# Altium schematic symbol library jlcpcb_2025_04_capacitors_extended_0603.schlib: 3668 symbols (part 5 of 20)
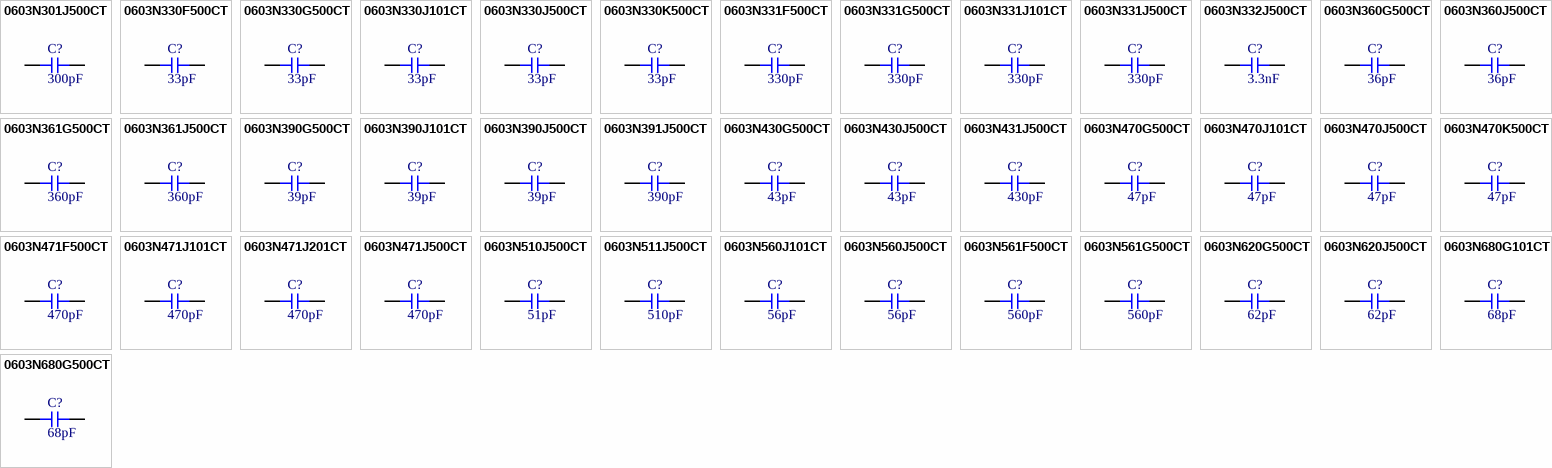
[diagram p95: symbols 0603N301J500CT to 0603N680G500CT]

## 0603N330J101CT
designator C?  Capacitance: 33pF  (hidden comment: *)
Capacitor, Ceramic (MLCC), 33pF, ±5%, 100V, NP0, ±5%, SMD 0603; Manufacturer: Walsin Tech Corp; Manufacturer Part Number: 0603N330J101CT; Package Size: 0603; JLCPCB Basic Part: No; JLCPCB Part Number: C77447; Supplier 1: LCSC; Category: Capacitors - MLCC; Supplier Part Number 1: C77447; Tolerance: ±5%; Voltage Rating: 100V; Temperature Coefficient: NP0; RoHS: Yes; ComponentLink1Description: Datasheet; ComponentLink1URL: https://wmsc.lcsc.com/wmsc/upload/file/pdf/v2/lcsc/2304140030_Walsin-Tech-Corp-0603N330J101CT_C77447.pdf; ComponentLink2Description: JLCPCB Part URL; ComponentLink2URL: https://jlcpcb.com/partdetail/C77447; ComponentLink3Description: LCSC Part URL; ComponentLink3URL: https://lcsc.com/product-detail/Multilayer-Ceramic-Capacitors-MLCC---SMD-SMT_Walsin-Tech-Corp-Walsin-Tech-Corp-0603N330J101CT_C77447.html
footprint CAP-0603 (0603 (1608M) Capacitor)
pins: 1, 2

## 0603N330J500CT
designator C?  Capacitance: 33pF  (hidden comment: *)
Capacitor, Ceramic (MLCC), 33pF, ±5%, 50V, NP0, ±5%, SMD 0603; Manufacturer: Walsin Tech Corp; Manufacturer Part Number: 0603N330J500CT; Package Size: 0603; JLCPCB Basic Part: No; JLCPCB Part Number: C302065; Supplier 1: LCSC; Category: Capacitors - MLCC; Supplier Part Number 1: C302065; Tolerance: ±5%; Voltage Rating: 50V; Temperature Coefficient: NP0; RoHS: Yes; ComponentLink1Description: Datasheet; ComponentLink1URL: https://wmsc.lcsc.com/wmsc/upload/file/pdf/v2/lcsc/2304140030_Walsin-Tech-Corp-0603N330J500CT_C302065.pdf; ComponentLink2Description: JLCPCB Part URL; ComponentLink2URL: https://jlcpcb.com/partdetail/C302065; ComponentLink3Description: LCSC Part URL; ComponentLink3URL: https://lcsc.com/product-detail/Multilayer-Ceramic-Capacitors-MLCC---SMD-SMT_Walsin-Tech-Corp-Walsin-Tech-Corp-0603N330J500CT_C302065.html
footprint CAP-0603 (0603 (1608M) Capacitor)
pins: 1, 2

## 0603N330K500CT
designator C?  Capacitance: 33pF  (hidden comment: *)
Capacitor, Ceramic (MLCC), 33pF, ±10%, 50V, NP0, ±10%, SMD 0603; Manufacturer: Walsin Tech Corp; Manufacturer Part Number: 0603N330K500CT; Package Size: 0603; JLCPCB Basic Part: No; JLCPCB Part Number: C296063; Supplier 1: LCSC; Category: Capacitors - MLCC; Supplier Part Number 1: C296063; Tolerance: ±10%; Voltage Rating: 50V; Temperature Coefficient: NP0; RoHS: Yes; ComponentLink1Description: Datasheet; ComponentLink1URL: https://wmsc.lcsc.com/wmsc/upload/file/pdf/v2/lcsc/2304140030_Walsin-Tech-Corp-0603N330K500CT_C296063.pdf; ComponentLink2Description: JLCPCB Part URL; ComponentLink2URL: https://jlcpcb.com/partdetail/C296063; ComponentLink3Description: LCSC Part URL; ComponentLink3URL: https://lcsc.com/product-detail/Multilayer-Ceramic-Capacitors-MLCC---SMD-SMT_Walsin-Tech-Corp-Walsin-Tech-Corp-0603N330K500CT_C296063.html
footprint CAP-0603 (0603 (1608M) Capacitor)
pins: 1, 2

## 0603N331F500CT
designator C?  Capacitance: 330pF  (hidden comment: *)
Capacitor, Ceramic (MLCC), 330pF, ±1%, 50V, NP0, ±1%, SMD 0603; Manufacturer: Walsin Tech Corp; Manufacturer Part Number: 0603N331F500CT; Package Size: 0603; JLCPCB Basic Part: No; JLCPCB Part Number: C458902; Supplier 1: LCSC; Category: Capacitors - MLCC; Supplier Part Number 1: C458902; Tolerance: ±1%; Voltage Rating: 50V; Temperature Coefficient: NP0; RoHS: Yes; ComponentLink1Description: Datasheet; ComponentLink1URL: https://wmsc.lcsc.com/wmsc/upload/file/pdf/v2/lcsc/2304140030_Walsin-Tech-Corp-0603N331F500CT_C458902.pdf; ComponentLink2Description: JLCPCB Part URL; ComponentLink2URL: https://jlcpcb.com/partdetail/C458902; ComponentLink3Description: LCSC Part URL; ComponentLink3URL: https://lcsc.com/product-detail/Multilayer-Ceramic-Capacitors-MLCC---SMD-SMT_Walsin-Tech-Corp-Walsin-Tech-Corp-0603N331F500CT_C458902.html
footprint CAP-0603 (0603 (1608M) Capacitor)
pins: 1, 2

## 0603N331G500CT
designator C?  Capacitance: 330pF  (hidden comment: *)
Capacitor, Ceramic (MLCC), 330pF, ±2%, 50V, NP0, ±2%, SMD 0603; Manufacturer: Walsin Tech Corp; Manufacturer Part Number: 0603N331G500CT; Package Size: 0603; JLCPCB Basic Part: No; JLCPCB Part Number: C458903; Supplier 1: LCSC; Category: Capacitors - MLCC; Supplier Part Number 1: C458903; Tolerance: ±2%; Voltage Rating: 50V; Temperature Coefficient: NP0; RoHS: Yes; ComponentLink1Description: Datasheet; ComponentLink1URL: https://wmsc.lcsc.com/wmsc/upload/file/pdf/v2/lcsc/2304140030_Walsin-Tech-Corp-0603N331G500CT_C458903.pdf; ComponentLink2Description: JLCPCB Part URL; ComponentLink2URL: https://jlcpcb.com/partdetail/C458903; ComponentLink3Description: LCSC Part URL; ComponentLink3URL: https://lcsc.com/product-detail/Multilayer-Ceramic-Capacitors-MLCC---SMD-SMT_Walsin-Tech-Corp-Walsin-Tech-Corp-0603N331G500CT_C458903.html
footprint CAP-0603 (0603 (1608M) Capacitor)
pins: 1, 2

## 0603N331J101CT
designator C?  Capacitance: 330pF  (hidden comment: *)
Capacitor, Ceramic (MLCC), 330pF, ±5%, 100V, NP0, ±5%, SMD 0603; Manufacturer: Walsin Tech Corp; Manufacturer Part Number: 0603N331J101CT; Package Size: 0603; JLCPCB Basic Part: No; JLCPCB Part Number: C388047; Supplier 1: LCSC; Category: Capacitors - MLCC; Supplier Part Number 1: C388047; Tolerance: ±5%; Voltage Rating: 100V; Temperature Coefficient: NP0; RoHS: Yes; ComponentLink1Description: Datasheet; ComponentLink1URL: https://wmsc.lcsc.com/wmsc/upload/file/pdf/v2/lcsc/2304140030_Walsin-Tech-Corp-0603N331J101CT_C388047.pdf; ComponentLink2Description: JLCPCB Part URL; ComponentLink2URL: https://jlcpcb.com/partdetail/C388047; ComponentLink3Description: LCSC Part URL; ComponentLink3URL: https://lcsc.com/product-detail/Multilayer-Ceramic-Capacitors-MLCC---SMD-SMT_Walsin-Tech-Corp-Walsin-Tech-Corp-0603N331J101CT_C388047.html
footprint CAP-0603 (0603 (1608M) Capacitor)
pins: 1, 2

## 0603N331J500CT
designator C?  Capacitance: 330pF  (hidden comment: *)
Capacitor, Ceramic (MLCC), 330pF, ±5%, 50V, NP0, ±5%, SMD 0603; Manufacturer: Walsin Tech Corp; Manufacturer Part Number: 0603N331J500CT; Package Size: 0603; JLCPCB Basic Part: No; JLCPCB Part Number: C340637; Supplier 1: LCSC; Category: Capacitors - MLCC; Supplier Part Number 1: C340637; Tolerance: ±5%; Voltage Rating: 50V; Temperature Coefficient: NP0; RoHS: Yes; ComponentLink1Description: Datasheet; ComponentLink1URL: https://wmsc.lcsc.com/wmsc/upload/file/pdf/v2/lcsc/2304140030_Walsin-Tech-Corp-0603N331J500CT_C340637.pdf; ComponentLink2Description: JLCPCB Part URL; ComponentLink2URL: https://jlcpcb.com/partdetail/C340637; ComponentLink3Description: LCSC Part URL; ComponentLink3URL: https://lcsc.com/product-detail/Multilayer-Ceramic-Capacitors-MLCC---SMD-SMT_Walsin-Tech-Corp-Walsin-Tech-Corp-0603N331J500CT_C340637.html
footprint CAP-0603 (0603 (1608M) Capacitor)
pins: 1, 2

## 0603N332J500CT
designator C?  Capacitance: 3.3nF  (hidden comment: *)
Capacitor, Ceramic (MLCC), 3.3nF, ±5%, 50V, NP0, ±5%, SMD 0603; Manufacturer: Walsin Tech Corp; Manufacturer Part Number: 0603N332J500CT; Package Size: 0603; JLCPCB Basic Part: No; JLCPCB Part Number: C152910; Supplier 1: LCSC; Category: Capacitors - MLCC; Supplier Part Number 1: C152910; Tolerance: ±5%; Voltage Rating: 50V; Temperature Coefficient: NP0; RoHS: Yes; ComponentLink1Description: Datasheet; ComponentLink1URL: https://wmsc.lcsc.com/wmsc/upload/file/pdf/v2/lcsc/2304140030_Walsin-Tech-Corp-0603N332J500CT_C152910.pdf; ComponentLink2Description: JLCPCB Part URL; ComponentLink2URL: https://jlcpcb.com/partdetail/C152910; ComponentLink3Description: LCSC Part URL; ComponentLink3URL: https://lcsc.com/product-detail/Multilayer-Ceramic-Capacitors-MLCC---SMD-SMT_Walsin-Tech-Corp-Walsin-Tech-Corp-0603N332J500CT_C152910.html
footprint CAP-0603 (0603 (1608M) Capacitor)
pins: 1, 2

## 0603N360G500CT
designator C?  Capacitance: 36pF  (hidden comment: *)
Capacitor, Ceramic (MLCC), 36pF, ±2%, 50V, NP0, ±2%, SMD 0603; Manufacturer: Walsin Tech Corp; Manufacturer Part Number: 0603N360G500CT; Package Size: 0603; JLCPCB Basic Part: No; JLCPCB Part Number: C152909; Supplier 1: LCSC; Category: Capacitors - MLCC; Supplier Part Number 1: C152909; Tolerance: ±2%; Voltage Rating: 50V; Temperature Coefficient: NP0; RoHS: Yes; ComponentLink1Description: Datasheet; ComponentLink1URL: https://wmsc.lcsc.com/wmsc/upload/file/pdf/v2/lcsc/2304140030_Walsin-Tech-Corp-0603N360G500CT_C152909.pdf; ComponentLink2Description: JLCPCB Part URL; ComponentLink2URL: https://jlcpcb.com/partdetail/C152909; ComponentLink3Description: LCSC Part URL; ComponentLink3URL: https://lcsc.com/product-detail/Multilayer-Ceramic-Capacitors-MLCC---SMD-SMT_Walsin-Tech-Corp-Walsin-Tech-Corp-0603N360G500CT_C152909.html
footprint CAP-0603 (0603 (1608M) Capacitor)
pins: 1, 2

## 0603N360J500CT
designator C?  Capacitance: 36pF  (hidden comment: *)
Capacitor, Ceramic (MLCC), 36pF, ±5%, 50V, NP0, ±5%, SMD 0603; Manufacturer: Walsin Tech Corp; Manufacturer Part Number: 0603N360J500CT; Package Size: 0603; JLCPCB Basic Part: No; JLCPCB Part Number: C388048; Supplier 1: LCSC; Category: Capacitors - MLCC; Supplier Part Number 1: C388048; Tolerance: ±5%; Voltage Rating: 50V; Temperature Coefficient: NP0; RoHS: Yes; ComponentLink1Description: Datasheet; ComponentLink1URL: https://wmsc.lcsc.com/wmsc/upload/file/pdf/v2/lcsc/2304140030_Walsin-Tech-Corp-0603N360J500CT_C388048.pdf; ComponentLink2Description: JLCPCB Part URL; ComponentLink2URL: https://jlcpcb.com/partdetail/C388048; ComponentLink3Description: LCSC Part URL; ComponentLink3URL: https://lcsc.com/product-detail/Multilayer-Ceramic-Capacitors-MLCC---SMD-SMT_Walsin-Tech-Corp-Walsin-Tech-Corp-0603N360J500CT_C388048.html
footprint CAP-0603 (0603 (1608M) Capacitor)
pins: 1, 2

## 0603N361G500CT
designator C?  Capacitance: 360pF  (hidden comment: *)
Capacitor, Ceramic (MLCC), 360pF, ±2%, 50V, NP0, ±2%, SMD 0603; Manufacturer: Walsin Tech Corp; Manufacturer Part Number: 0603N361G500CT; Package Size: 0603; JLCPCB Basic Part: No; JLCPCB Part Number: C458904; Supplier 1: LCSC; Category: Capacitors - MLCC; Supplier Part Number 1: C458904; Tolerance: ±2%; Voltage Rating: 50V; Temperature Coefficient: NP0; RoHS: Yes; ComponentLink1Description: Datasheet; ComponentLink1URL: https://wmsc.lcsc.com/wmsc/upload/file/pdf/v2/lcsc/2304140030_Walsin-Tech-Corp-0603N361G500CT_C458904.pdf; ComponentLink2Description: JLCPCB Part URL; ComponentLink2URL: https://jlcpcb.com/partdetail/C458904; ComponentLink3Description: LCSC Part URL; ComponentLink3URL: https://lcsc.com/product-detail/Multilayer-Ceramic-Capacitors-MLCC---SMD-SMT_Walsin-Tech-Corp-Walsin-Tech-Corp-0603N361G500CT_C458904.html
footprint CAP-0603 (0603 (1608M) Capacitor)
pins: 1, 2

## 0603N361J500CT
designator C?  Capacitance: 360pF  (hidden comment: *)
Capacitor, Ceramic (MLCC), 360pF, ±5%, 50V, NP0, ±5%, SMD 0603; Manufacturer: Walsin Tech Corp; Manufacturer Part Number: 0603N361J500CT; Package Size: 0603; JLCPCB Basic Part: No; JLCPCB Part Number: C237214; Supplier 1: LCSC; Category: Capacitors - MLCC; Supplier Part Number 1: C237214; Tolerance: ±5%; Voltage Rating: 50V; Temperature Coefficient: NP0; RoHS: Yes; ComponentLink1Description: Datasheet; ComponentLink1URL: https://wmsc.lcsc.com/wmsc/upload/file/pdf/v2/lcsc/2304140030_Walsin-Tech-Corp-0603N361J500CT_C237214.pdf; ComponentLink2Description: JLCPCB Part URL; ComponentLink2URL: https://jlcpcb.com/partdetail/C237214; ComponentLink3Description: LCSC Part URL; ComponentLink3URL: https://lcsc.com/product-detail/Multilayer-Ceramic-Capacitors-MLCC---SMD-SMT_Walsin-Tech-Corp-Walsin-Tech-Corp-0603N361J500CT_C237214.html
footprint CAP-0603 (0603 (1608M) Capacitor)
pins: 1, 2

## 0603N390G500CT
designator C?  Capacitance: 39pF  (hidden comment: *)
Capacitor, Ceramic (MLCC), 39pF, ±2%, 50V, NP0, ±2%, SMD 0603; Manufacturer: Walsin Tech Corp; Manufacturer Part Number: 0603N390G500CT; Package Size: 0603; JLCPCB Basic Part: No; JLCPCB Part Number: C388049; Supplier 1: LCSC; Category: Capacitors - MLCC; Supplier Part Number 1: C388049; Tolerance: ±2%; Voltage Rating: 50V; Temperature Coefficient: NP0; RoHS: Yes; ComponentLink1Description: Datasheet; ComponentLink1URL: https://wmsc.lcsc.com/wmsc/upload/file/pdf/v2/lcsc/2304140030_Walsin-Tech-Corp-0603N390G500CT_C388049.pdf; ComponentLink2Description: JLCPCB Part URL; ComponentLink2URL: https://jlcpcb.com/partdetail/C388049; ComponentLink3Description: LCSC Part URL; ComponentLink3URL: https://lcsc.com/product-detail/Multilayer-Ceramic-Capacitors-MLCC---SMD-SMT_Walsin-Tech-Corp-Walsin-Tech-Corp-0603N390G500CT_C388049.html
footprint CAP-0603 (0603 (1608M) Capacitor)
pins: 1, 2

## 0603N390J101CT
designator C?  Capacitance: 39pF  (hidden comment: *)
Capacitor, Ceramic (MLCC), 39pF, ±5%, 100V, NP0, ±5%, SMD 0603; Manufacturer: Walsin Tech Corp; Manufacturer Part Number: 0603N390J101CT; Package Size: 0603; JLCPCB Basic Part: No; JLCPCB Part Number: C388050; Supplier 1: LCSC; Category: Capacitors - MLCC; Supplier Part Number 1: C388050; Tolerance: ±5%; Voltage Rating: 100V; Temperature Coefficient: NP0; RoHS: Yes; ComponentLink1Description: Datasheet; ComponentLink1URL: https://wmsc.lcsc.com/wmsc/upload/file/pdf/v2/lcsc/2304140030_Walsin-Tech-Corp-0603N390J101CT_C388050.pdf; ComponentLink2Description: JLCPCB Part URL; ComponentLink2URL: https://jlcpcb.com/partdetail/C388050; ComponentLink3Description: LCSC Part URL; ComponentLink3URL: https://lcsc.com/product-detail/Multilayer-Ceramic-Capacitors-MLCC---SMD-SMT_Walsin-Tech-Corp-Walsin-Tech-Corp-0603N390J101CT_C388050.html
footprint CAP-0603 (0603 (1608M) Capacitor)
pins: 1, 2

## 0603N390J500CT
designator C?  Capacitance: 39pF  (hidden comment: *)
Capacitor, Ceramic (MLCC), 39pF, ±5%, 50V, NP0, ±5%, SMD 0603; Manufacturer: Walsin Tech Corp; Manufacturer Part Number: 0603N390J500CT; Package Size: 0603; JLCPCB Basic Part: No; JLCPCB Part Number: C302067; Supplier 1: LCSC; Category: Capacitors - MLCC; Supplier Part Number 1: C302067; Tolerance: ±5%; Voltage Rating: 50V; Temperature Coefficient: NP0; RoHS: Yes; ComponentLink1Description: Datasheet; ComponentLink1URL: https://wmsc.lcsc.com/wmsc/upload/file/pdf/v2/lcsc/2304140030_Walsin-Tech-Corp-0603N390J500CT_C302067.pdf; ComponentLink2Description: JLCPCB Part URL; ComponentLink2URL: https://jlcpcb.com/partdetail/C302067; ComponentLink3Description: LCSC Part URL; ComponentLink3URL: https://lcsc.com/product-detail/Multilayer-Ceramic-Capacitors-MLCC---SMD-SMT_Walsin-Tech-Corp-Walsin-Tech-Corp-0603N390J500CT_C302067.html
footprint CAP-0603 (0603 (1608M) Capacitor)
pins: 1, 2

## 0603N391J500CT
designator C?  Capacitance: 390pF  (hidden comment: *)
Capacitor, Ceramic (MLCC), 390pF, ±5%, 50V, NP0, ±5%, SMD 0603; Manufacturer: Walsin Tech Corp; Manufacturer Part Number: 0603N391J500CT; Package Size: 0603; JLCPCB Basic Part: No; JLCPCB Part Number: C152906; Supplier 1: LCSC; Category: Capacitors - MLCC; Supplier Part Number 1: C152906; Tolerance: ±5%; Voltage Rating: 50V; Temperature Coefficient: NP0; RoHS: Yes; ComponentLink1Description: Datasheet; ComponentLink1URL: https://wmsc.lcsc.com/wmsc/upload/file/pdf/v2/lcsc/2304140030_Walsin-Tech-Corp-0603N391J500CT_C152906.pdf; ComponentLink2Description: JLCPCB Part URL; ComponentLink2URL: https://jlcpcb.com/partdetail/C152906; ComponentLink3Description: LCSC Part URL; ComponentLink3URL: https://lcsc.com/product-detail/Multilayer-Ceramic-Capacitors-MLCC---SMD-SMT_Walsin-Tech-Corp-Walsin-Tech-Corp-0603N391J500CT_C152906.html
footprint CAP-0603 (0603 (1608M) Capacitor)
pins: 1, 2

## 0603N430G500CT
designator C?  Capacitance: 43pF  (hidden comment: *)
Capacitor, Ceramic (MLCC), 43pF, ±2%, 50V, NP0, ±2%, SMD 0603; Manufacturer: Walsin Tech Corp; Manufacturer Part Number: 0603N430G500CT; Package Size: 0603; JLCPCB Basic Part: No; JLCPCB Part Number: C302068; Supplier 1: LCSC; Category: Capacitors - MLCC; Supplier Part Number 1: C302068; Tolerance: ±2%; Voltage Rating: 50V; Temperature Coefficient: NP0; RoHS: Yes; ComponentLink1Description: Datasheet; ComponentLink1URL: https://wmsc.lcsc.com/wmsc/upload/file/pdf/v2/lcsc/2304140030_Walsin-Tech-Corp-0603N430G500CT_C302068.pdf; ComponentLink2Description: JLCPCB Part URL; ComponentLink2URL: https://jlcpcb.com/partdetail/C302068; ComponentLink3Description: LCSC Part URL; ComponentLink3URL: https://lcsc.com/product-detail/Multilayer-Ceramic-Capacitors-MLCC---SMD-SMT_Walsin-Tech-Corp-Walsin-Tech-Corp-0603N430G500CT_C302068.html
footprint CAP-0603 (0603 (1608M) Capacitor)
pins: 1, 2

## 0603N430J500CT
designator C?  Capacitance: 43pF  (hidden comment: *)
Capacitor, Ceramic (MLCC), 43pF, ±5%, 50V, NP0, ±5%, SMD 0603; Manufacturer: Walsin Tech Corp; Manufacturer Part Number: 0603N430J500CT; Package Size: 0603; JLCPCB Basic Part: No; JLCPCB Part Number: C388054; Supplier 1: LCSC; Category: Capacitors - MLCC; Supplier Part Number 1: C388054; Tolerance: ±5%; Voltage Rating: 50V; Temperature Coefficient: NP0; RoHS: Yes; ComponentLink1Description: Datasheet; ComponentLink1URL: https://wmsc.lcsc.com/wmsc/upload/file/pdf/v2/lcsc/2304140030_Walsin-Tech-Corp-0603N430J500CT_C388054.pdf; ComponentLink2Description: JLCPCB Part URL; ComponentLink2URL: https://jlcpcb.com/partdetail/C388054; ComponentLink3Description: LCSC Part URL; ComponentLink3URL: https://lcsc.com/product-detail/Multilayer-Ceramic-Capacitors-MLCC---SMD-SMT_Walsin-Tech-Corp-Walsin-Tech-Corp-0603N430J500CT_C388054.html
footprint CAP-0603 (0603 (1608M) Capacitor)
pins: 1, 2

## 0603N431J500CT
designator C?  Capacitance: 430pF  (hidden comment: *)
Capacitor, Ceramic (MLCC), 430pF, ±5%, 50V, NP0, ±5%, SMD 0603; Manufacturer: Walsin Tech Corp; Manufacturer Part Number: 0603N431J500CT; Package Size: 0603; JLCPCB Basic Part: No; JLCPCB Part Number: C237216; Supplier 1: LCSC; Category: Capacitors - MLCC; Supplier Part Number 1: C237216; Tolerance: ±5%; Voltage Rating: 50V; Temperature Coefficient: NP0; RoHS: Yes; ComponentLink1Description: Datasheet; ComponentLink1URL: https://wmsc.lcsc.com/wmsc/upload/file/pdf/v2/lcsc/2304140030_Walsin-Tech-Corp-0603N431J500CT_C237216.pdf; ComponentLink2Description: JLCPCB Part URL; ComponentLink2URL: https://jlcpcb.com/partdetail/C237216; ComponentLink3Description: LCSC Part URL; ComponentLink3URL: https://lcsc.com/product-detail/Multilayer-Ceramic-Capacitors-MLCC---SMD-SMT_Walsin-Tech-Corp-Walsin-Tech-Corp-0603N431J500CT_C237216.html
footprint CAP-0603 (0603 (1608M) Capacitor)
pins: 1, 2

## 0603N470G500CT
designator C?  Capacitance: 47pF  (hidden comment: *)
Capacitor, Ceramic (MLCC), 47pF, ±2%, 50V, NP0, ±2%, SMD 0603; Manufacturer: Walsin Tech Corp; Manufacturer Part Number: 0603N470G500CT; Package Size: 0603; JLCPCB Basic Part: No; JLCPCB Part Number: C388055; Supplier 1: LCSC; Category: Capacitors - MLCC; Supplier Part Number 1: C388055; Tolerance: ±2%; Voltage Rating: 50V; Temperature Coefficient: NP0; RoHS: Yes; ComponentLink1Description: Datasheet; ComponentLink1URL: https://wmsc.lcsc.com/wmsc/upload/file/pdf/v2/lcsc/2304140030_Walsin-Tech-Corp-0603N470G500CT_C388055.pdf; ComponentLink2Description: JLCPCB Part URL; ComponentLink2URL: https://jlcpcb.com/partdetail/C388055; ComponentLink3Description: LCSC Part URL; ComponentLink3URL: https://lcsc.com/product-detail/Multilayer-Ceramic-Capacitors-MLCC---SMD-SMT_Walsin-Tech-Corp-Walsin-Tech-Corp-0603N470G500CT_C388055.html
footprint CAP-0603 (0603 (1608M) Capacitor)
pins: 1, 2

## 0603N470J101CT
designator C?  Capacitance: 47pF  (hidden comment: *)
Capacitor, Ceramic (MLCC), 47pF, ±5%, 100V, NP0, ±5%, SMD 0603; Manufacturer: Walsin Tech Corp; Manufacturer Part Number: 0603N470J101CT; Package Size: 0603; JLCPCB Basic Part: No; JLCPCB Part Number: C123570; Supplier 1: LCSC; Category: Capacitors - MLCC; Supplier Part Number 1: C123570; Tolerance: ±5%; Voltage Rating: 100V; Temperature Coefficient: NP0; RoHS: Yes; ComponentLink1Description: Datasheet; ComponentLink1URL: https://wmsc.lcsc.com/wmsc/upload/file/pdf/v2/lcsc/2304140030_Walsin-Tech-Corp-0603N470J101CT_C123570.pdf; ComponentLink2Description: JLCPCB Part URL; ComponentLink2URL: https://jlcpcb.com/partdetail/C123570; ComponentLink3Description: LCSC Part URL; ComponentLink3URL: https://lcsc.com/product-detail/Multilayer-Ceramic-Capacitors-MLCC---SMD-SMT_Walsin-Tech-Corp-Walsin-Tech-Corp-0603N470J101CT_C123570.html
footprint CAP-0603 (0603 (1608M) Capacitor)
pins: 1, 2

## 0603N470J500CT
designator C?  Capacitance: 47pF  (hidden comment: *)
Capacitor, Ceramic (MLCC), 47pF, ±5%, 50V, NP0, ±5%, SMD 0603; Manufacturer: Walsin Tech Corp; Manufacturer Part Number: 0603N470J500CT; Package Size: 0603; JLCPCB Basic Part: No; JLCPCB Part Number: C302069; Supplier 1: LCSC; Category: Capacitors - MLCC; Supplier Part Number 1: C302069; Tolerance: ±5%; Voltage Rating: 50V; Temperature Coefficient: NP0; RoHS: Yes; ComponentLink1Description: Datasheet; ComponentLink1URL: https://wmsc.lcsc.com/wmsc/upload/file/pdf/v2/lcsc/2304140030_Walsin-Tech-Corp-0603N470J500CT_C302069.pdf; ComponentLink2Description: JLCPCB Part URL; ComponentLink2URL: https://jlcpcb.com/partdetail/C302069; ComponentLink3Description: LCSC Part URL; ComponentLink3URL: https://lcsc.com/product-detail/Multilayer-Ceramic-Capacitors-MLCC---SMD-SMT_Walsin-Tech-Corp-Walsin-Tech-Corp-0603N470J500CT_C302069.html
footprint CAP-0603 (0603 (1608M) Capacitor)
pins: 1, 2

## 0603N470K500CT
designator C?  Capacitance: 47pF  (hidden comment: *)
Capacitor, Ceramic (MLCC), 47pF, ±10%, 50V, NP0, ±10%, SMD 0603; Manufacturer: Walsin Tech Corp; Manufacturer Part Number: 0603N470K500CT; Package Size: 0603; JLCPCB Basic Part: No; JLCPCB Part Number: C296065; Supplier 1: LCSC; Category: Capacitors - MLCC; Supplier Part Number 1: C296065; Tolerance: ±10%; Voltage Rating: 50V; Temperature Coefficient: NP0; RoHS: Yes; ComponentLink1Description: Datasheet; ComponentLink1URL: https://wmsc.lcsc.com/wmsc/upload/file/pdf/v2/lcsc/2304140030_Walsin-Tech-Corp-0603N470K500CT_C296065.pdf; ComponentLink2Description: JLCPCB Part URL; ComponentLink2URL: https://jlcpcb.com/partdetail/C296065; ComponentLink3Description: LCSC Part URL; ComponentLink3URL: https://lcsc.com/product-detail/Multilayer-Ceramic-Capacitors-MLCC---SMD-SMT_Walsin-Tech-Corp-Walsin-Tech-Corp-0603N470K500CT_C296065.html
footprint CAP-0603 (0603 (1608M) Capacitor)
pins: 1, 2

## 0603N471F500CT
designator C?  Capacitance: 470pF  (hidden comment: *)
Capacitor, Ceramic (MLCC), 470pF, ±1%, 50V, NP0, ±1%, SMD 0603; Manufacturer: Walsin Tech Corp; Manufacturer Part Number: 0603N471F500CT; Package Size: 0603; JLCPCB Basic Part: No; JLCPCB Part Number: C396711; Supplier 1: LCSC; Category: Capacitors - MLCC; Supplier Part Number 1: C396711; Tolerance: ±1%; Voltage Rating: 50V; Temperature Coefficient: NP0; RoHS: Yes; ComponentLink1Description: Datasheet; ComponentLink1URL: https://wmsc.lcsc.com/wmsc/upload/file/pdf/v2/lcsc/2309201536_Walsin-Tech-Corp-0603N471F500CT_C396711.pdf; ComponentLink2Description: JLCPCB Part URL; ComponentLink2URL: https://jlcpcb.com/partdetail/C396711; ComponentLink3Description: LCSC Part URL; ComponentLink3URL: https://lcsc.com/product-detail/Multilayer-Ceramic-Capacitors-MLCC---SMD-SMT_Walsin-Tech-Corp-Walsin-Tech-Corp-0603N471F500CT_C396711.html
footprint CAP-0603 (0603 (1608M) Capacitor)
pins: 1, 2

## 0603N471J101CT
designator C?  Capacitance: 470pF  (hidden comment: *)
Capacitor, Ceramic (MLCC), 470pF, ±5%, 100V, NP0, ±5%, SMD 0603; Manufacturer: Walsin Tech Corp; Manufacturer Part Number: 0603N471J101CT; Package Size: 0603; JLCPCB Basic Part: No; JLCPCB Part Number: C123572; Supplier 1: LCSC; Category: Capacitors - MLCC; Supplier Part Number 1: C123572; Tolerance: ±5%; Voltage Rating: 100V; Temperature Coefficient: NP0; RoHS: Yes; ComponentLink1Description: Datasheet; ComponentLink1URL: https://wmsc.lcsc.com/wmsc/upload/file/pdf/v2/lcsc/2304140030_Walsin-Tech-Corp-0603N471J101CT_C123572.pdf; ComponentLink2Description: JLCPCB Part URL; ComponentLink2URL: https://jlcpcb.com/partdetail/C123572; ComponentLink3Description: LCSC Part URL; ComponentLink3URL: https://lcsc.com/product-detail/Multilayer-Ceramic-Capacitors-MLCC---SMD-SMT_Walsin-Tech-Corp-Walsin-Tech-Corp-0603N471J101CT_C123572.html
footprint CAP-0603 (0603 (1608M) Capacitor)
pins: 1, 2

## 0603N471J201CT
designator C?  Capacitance: 470pF  (hidden comment: *)
Capacitor, Ceramic (MLCC), 470pF, ±5%, NP0, ±5%, SMD 0603; Manufacturer: Walsin Tech Corp; Manufacturer Part Number: 0603N471J201CT; Package Size: 0603; JLCPCB Basic Part: No; JLCPCB Part Number: C5122267; Supplier 1: LCSC; Category: Capacitors - MLCC; Supplier Part Number 1: C5122267; Tolerance: ±5%; Temperature Coefficient: NP0; RoHS: Yes; ComponentLink1Description: Datasheet; ComponentLink1URL: https://wmsc.lcsc.com/wmsc/upload/file/pdf/v2/lcsc/2208151830_Walsin-Tech-Corp-0603N471J201CT_C5122267.pdf; ComponentLink2Description: JLCPCB Part URL; ComponentLink2URL: https://jlcpcb.com/partdetail/C5122267; ComponentLink3Description: LCSC Part URL; ComponentLink3URL: https://lcsc.com/product-detail/Multilayer-Ceramic-Capacitors-MLCC---SMD-SMT_Walsin-Tech-Corp-Walsin-Tech-Corp-0603N471J201CT_C5122267.html
footprint CAP-0603 (0603 (1608M) Capacitor)
pins: 1, 2

## 0603N471J500CT
designator C?  Capacitance: 470pF  (hidden comment: *)
Capacitor, Ceramic (MLCC), 470pF, ±5%, 50V, NP0, ±5%, SMD 0603; Manufacturer: Walsin Tech Corp; Manufacturer Part Number: 0603N471J500CT; Package Size: 0603; JLCPCB Basic Part: No; JLCPCB Part Number: C123573; Supplier 1: LCSC; Category: Capacitors - MLCC; Supplier Part Number 1: C123573; Tolerance: ±5%; Voltage Rating: 50V; Temperature Coefficient: NP0; RoHS: Yes; ComponentLink1Description: Datasheet; ComponentLink1URL: https://wmsc.lcsc.com/wmsc/upload/file/pdf/v2/lcsc/2304140030_Walsin-Tech-Corp-0603N471J500CT_C123573.pdf; ComponentLink2Description: JLCPCB Part URL; ComponentLink2URL: https://jlcpcb.com/partdetail/C123573; ComponentLink3Description: LCSC Part URL; ComponentLink3URL: https://lcsc.com/product-detail/Multilayer-Ceramic-Capacitors-MLCC---SMD-SMT_Walsin-Tech-Corp-Walsin-Tech-Corp-0603N471J500CT_C123573.html
footprint CAP-0603 (0603 (1608M) Capacitor)
pins: 1, 2

## 0603N510J500CT
designator C?  Capacitance: 51pF  (hidden comment: *)
Capacitor, Ceramic (MLCC), 51pF, ±5%, 50V, NP0, ±5%, SMD 0603; Manufacturer: Walsin Tech Corp; Manufacturer Part Number: 0603N510J500CT; Package Size: 0603; JLCPCB Basic Part: No; JLCPCB Part Number: C123578; Supplier 1: LCSC; Category: Capacitors - MLCC; Supplier Part Number 1: C123578; Tolerance: ±5%; Voltage Rating: 50V; Temperature Coefficient: NP0; RoHS: Yes; ComponentLink1Description: Datasheet; ComponentLink1URL: https://wmsc.lcsc.com/wmsc/upload/file/pdf/v2/lcsc/2304140030_Walsin-Tech-Corp-0603N510J500CT_C123578.pdf; ComponentLink2Description: JLCPCB Part URL; ComponentLink2URL: https://jlcpcb.com/partdetail/C123578; ComponentLink3Description: LCSC Part URL; ComponentLink3URL: https://lcsc.com/product-detail/Multilayer-Ceramic-Capacitors-MLCC---SMD-SMT_Walsin-Tech-Corp-Walsin-Tech-Corp-0603N510J500CT_C123578.html
footprint CAP-0603 (0603 (1608M) Capacitor)
pins: 1, 2

## 0603N511J500CT
designator C?  Capacitance: 510pF  (hidden comment: *)
Capacitor, Ceramic (MLCC), 510pF, ±5%, 50V, NP0, ±5%, SMD 0603; Manufacturer: Walsin Tech Corp; Manufacturer Part Number: 0603N511J500CT; Package Size: 0603; JLCPCB Basic Part: No; JLCPCB Part Number: C152903; Supplier 1: LCSC; Category: Capacitors - MLCC; Supplier Part Number 1: C152903; Tolerance: ±5%; Voltage Rating: 50V; Temperature Coefficient: NP0; RoHS: Yes; ComponentLink1Description: Datasheet; ComponentLink1URL: https://wmsc.lcsc.com/wmsc/upload/file/pdf/v2/lcsc/2304140030_Walsin-Tech-Corp-0603N511J500CT_C152903.pdf; ComponentLink2Description: JLCPCB Part URL; ComponentLink2URL: https://jlcpcb.com/partdetail/C152903; ComponentLink3Description: LCSC Part URL; ComponentLink3URL: https://lcsc.com/product-detail/Multilayer-Ceramic-Capacitors-MLCC---SMD-SMT_Walsin-Tech-Corp-Walsin-Tech-Corp-0603N511J500CT_C152903.html
footprint CAP-0603 (0603 (1608M) Capacitor)
pins: 1, 2

## 0603N560J101CT
designator C?  Capacitance: 56pF  (hidden comment: *)
Capacitor, Ceramic (MLCC), 56pF, ±5%, 100V, NP0, ±5%, SMD 0603; Manufacturer: Walsin Tech Corp; Manufacturer Part Number: 0603N560J101CT; Package Size: 0603; JLCPCB Basic Part: No; JLCPCB Part Number: C388058; Supplier 1: LCSC; Category: Capacitors - MLCC; Supplier Part Number 1: C388058; Tolerance: ±5%; Voltage Rating: 100V; Temperature Coefficient: NP0; RoHS: Yes; ComponentLink1Description: Datasheet; ComponentLink1URL: https://wmsc.lcsc.com/wmsc/upload/file/pdf/v2/lcsc/2304140030_Walsin-Tech-Corp-0603N560J101CT_C388058.pdf; ComponentLink2Description: JLCPCB Part URL; ComponentLink2URL: https://jlcpcb.com/partdetail/C388058; ComponentLink3Description: LCSC Part URL; ComponentLink3URL: https://lcsc.com/product-detail/Multilayer-Ceramic-Capacitors-MLCC---SMD-SMT_Walsin-Tech-Corp-Walsin-Tech-Corp-0603N560J101CT_C388058.html
footprint CAP-0603 (0603 (1608M) Capacitor)
pins: 1, 2

## 0603N560J500CT
designator C?  Capacitance: 56pF  (hidden comment: *)
Capacitor, Ceramic (MLCC), 56pF, ±5%, 50V, NP0, ±5%, SMD 0603; Manufacturer: Walsin Tech Corp; Manufacturer Part Number: 0603N560J500CT; Package Size: 0603; JLCPCB Basic Part: No; JLCPCB Part Number: C302071; Supplier 1: LCSC; Category: Capacitors - MLCC; Supplier Part Number 1: C302071; Tolerance: ±5%; Voltage Rating: 50V; Temperature Coefficient: NP0; RoHS: Yes; ComponentLink1Description: Datasheet; ComponentLink1URL: https://wmsc.lcsc.com/wmsc/upload/file/pdf/v2/lcsc/2304140030_Walsin-Tech-Corp-0603N560J500CT_C302071.pdf; ComponentLink2Description: JLCPCB Part URL; ComponentLink2URL: https://jlcpcb.com/partdetail/C302071; ComponentLink3Description: LCSC Part URL; ComponentLink3URL: https://lcsc.com/product-detail/Multilayer-Ceramic-Capacitors-MLCC---SMD-SMT_Walsin-Tech-Corp-Walsin-Tech-Corp-0603N560J500CT_C302071.html
footprint CAP-0603 (0603 (1608M) Capacitor)
pins: 1, 2

## 0603N561F500CT
designator C?  Capacitance: 560pF  (hidden comment: *)
Capacitor, Ceramic (MLCC), 560pF, ±1%, 50V, C0G, ±1%, SMD 0603; Manufacturer: Walsin Tech Corp; Manufacturer Part Number: 0603N561F500CT; Package Size: 0603; JLCPCB Basic Part: No; JLCPCB Part Number: C3904892; Supplier 1: LCSC; Category: Capacitors - MLCC; Supplier Part Number 1: C3904892; Tolerance: ±1%; Voltage Rating: 50V; Temperature Coefficient: C0G; RoHS: Yes; ComponentLink1Description: Datasheet; ComponentLink1URL: https://wmsc.lcsc.com/wmsc/upload/file/pdf/v2/lcsc/2309201536_Walsin-Tech-Corp-0603N561F500CT_C3904892.pdf; ComponentLink2Description: JLCPCB Part URL; ComponentLink2URL: https://jlcpcb.com/partdetail/C3904892; ComponentLink3Description: LCSC Part URL; ComponentLink3URL: https://lcsc.com/product-detail/Multilayer-Ceramic-Capacitors-MLCC---SMD-SMT_Walsin-Tech-Corp-Walsin-Tech-Corp-0603N561F500CT_C3904892.html
footprint CAP-0603 (0603 (1608M) Capacitor)
pins: 1, 2

## 0603N561G500CT
designator C?  Capacitance: 560pF  (hidden comment: *)
Capacitor, Ceramic (MLCC), 560pF, ±2%, 50V, NP0, ±2%, SMD 0603; Manufacturer: Walsin Tech Corp; Manufacturer Part Number: 0603N561G500CT; Package Size: 0603; JLCPCB Basic Part: No; JLCPCB Part Number: C458906; Supplier 1: LCSC; Category: Capacitors - MLCC; Supplier Part Number 1: C458906; Tolerance: ±2%; Voltage Rating: 50V; Temperature Coefficient: NP0; RoHS: Yes; ComponentLink1Description: Datasheet; ComponentLink1URL: https://wmsc.lcsc.com/wmsc/upload/file/pdf/v2/lcsc/2304140030_Walsin-Tech-Corp-0603N561G500CT_C458906.pdf; ComponentLink2Description: JLCPCB Part URL; ComponentLink2URL: https://jlcpcb.com/partdetail/C458906; ComponentLink3Description: LCSC Part URL; ComponentLink3URL: https://lcsc.com/product-detail/Multilayer-Ceramic-Capacitors-MLCC---SMD-SMT_Walsin-Tech-Corp-Walsin-Tech-Corp-0603N561G500CT_C458906.html
footprint CAP-0603 (0603 (1608M) Capacitor)
pins: 1, 2

## 0603N620G500CT
designator C?  Capacitance: 62pF  (hidden comment: *)
Capacitor, Ceramic (MLCC), 62pF, ±2%, 50V, NP0, ±2%, SMD 0603; Manufacturer: Walsin Tech Corp; Manufacturer Part Number: 0603N620G500CT; Package Size: 0603; JLCPCB Basic Part: No; JLCPCB Part Number: C296067; Supplier 1: LCSC; Category: Capacitors - MLCC; Supplier Part Number 1: C296067; Tolerance: ±2%; Voltage Rating: 50V; Temperature Coefficient: NP0; RoHS: Yes; ComponentLink1Description: Datasheet; ComponentLink1URL: https://wmsc.lcsc.com/wmsc/upload/file/pdf/v2/lcsc/2304140030_Walsin-Tech-Corp-0603N620G500CT_C296067.pdf; ComponentLink2Description: JLCPCB Part URL; ComponentLink2URL: https://jlcpcb.com/partdetail/C296067; ComponentLink3Description: LCSC Part URL; ComponentLink3URL: https://lcsc.com/product-detail/Multilayer-Ceramic-Capacitors-MLCC---SMD-SMT_Walsin-Tech-Corp-Walsin-Tech-Corp-0603N620G500CT_C296067.html
footprint CAP-0603 (0603 (1608M) Capacitor)
pins: 1, 2

## 0603N620J500CT
designator C?  Capacitance: 62pF  (hidden comment: *)
Capacitor, Ceramic (MLCC), 62pF, ±5%, 50V, NP0, ±5%, SMD 0603; Manufacturer: Walsin Tech Corp; Manufacturer Part Number: 0603N620J500CT; Package Size: 0603; JLCPCB Basic Part: No; JLCPCB Part Number: C424851; Supplier 1: LCSC; Category: Capacitors - MLCC; Supplier Part Number 1: C424851; Tolerance: ±5%; Voltage Rating: 50V; Temperature Coefficient: NP0; RoHS: Yes; ComponentLink1Description: Datasheet; ComponentLink1URL: https://wmsc.lcsc.com/wmsc/upload/file/pdf/v2/lcsc/2304140030_Walsin-Tech-Corp-0603N620J500CT_C424851.pdf; ComponentLink2Description: JLCPCB Part URL; ComponentLink2URL: https://jlcpcb.com/partdetail/C424851; ComponentLink3Description: LCSC Part URL; ComponentLink3URL: https://lcsc.com/product-detail/Multilayer-Ceramic-Capacitors-MLCC---SMD-SMT_Walsin-Tech-Corp-Walsin-Tech-Corp-0603N620J500CT_C424851.html
footprint CAP-0603 (0603 (1608M) Capacitor)
pins: 1, 2

## 0603N680G101CT
designator C?  Capacitance: 68pF  (hidden comment: *)
Capacitor, Ceramic (MLCC), 68pF, ±2%, 100V, NP0, ±2%, SMD 0603; Manufacturer: Walsin Tech Corp; Manufacturer Part Number: 0603N680G101CT; Package Size: 0603; JLCPCB Basic Part: No; JLCPCB Part Number: C303826; Supplier 1: LCSC; Category: Capacitors - MLCC; Supplier Part Number 1: C303826; Tolerance: ±2%; Voltage Rating: 100V; Temperature Coefficient: NP0; RoHS: Yes; ComponentLink1Description: Datasheet; ComponentLink1URL: https://wmsc.lcsc.com/wmsc/upload/file/pdf/v2/lcsc/2304140030_Walsin-Tech-Corp-0603N680G101CT_C303826.pdf; ComponentLink2Description: JLCPCB Part URL; ComponentLink2URL: https://jlcpcb.com/partdetail/C303826; ComponentLink3Description: LCSC Part URL; ComponentLink3URL: https://lcsc.com/product-detail/Multilayer-Ceramic-Capacitors-MLCC---SMD-SMT_Walsin-Tech-Corp-Walsin-Tech-Corp-0603N680G101CT_C303826.html
footprint CAP-0603 (0603 (1608M) Capacitor)
pins: 1, 2

## 0603N680G500CT
designator C?  Capacitance: 68pF  (hidden comment: *)
Capacitor, Ceramic (MLCC), 68pF, ±2%, 50V, NP0, ±2%, SMD 0603; Manufacturer: Walsin Tech Corp; Manufacturer Part Number: 0603N680G500CT; Package Size: 0603; JLCPCB Basic Part: No; JLCPCB Part Number: C123586; Supplier 1: LCSC; Category: Capacitors - MLCC; Supplier Part Number 1: C123586; Tolerance: ±2%; Voltage Rating: 50V; Temperature Coefficient: NP0; RoHS: Yes; ComponentLink1Description: Datasheet; ComponentLink1URL: https://wmsc.lcsc.com/wmsc/upload/file/pdf/v2/lcsc/2304140030_Walsin-Tech-Corp-0603N680G500CT_C123586.pdf; ComponentLink2Description: JLCPCB Part URL; ComponentLink2URL: https://jlcpcb.com/partdetail/C123586; ComponentLink3Description: LCSC Part URL; ComponentLink3URL: https://lcsc.com/product-detail/Multilayer-Ceramic-Capacitors-MLCC---SMD-SMT_Walsin-Tech-Corp-Walsin-Tech-Corp-0603N680G500CT_C123586.html
footprint CAP-0603 (0603 (1608M) Capacitor)
pins: 1, 2

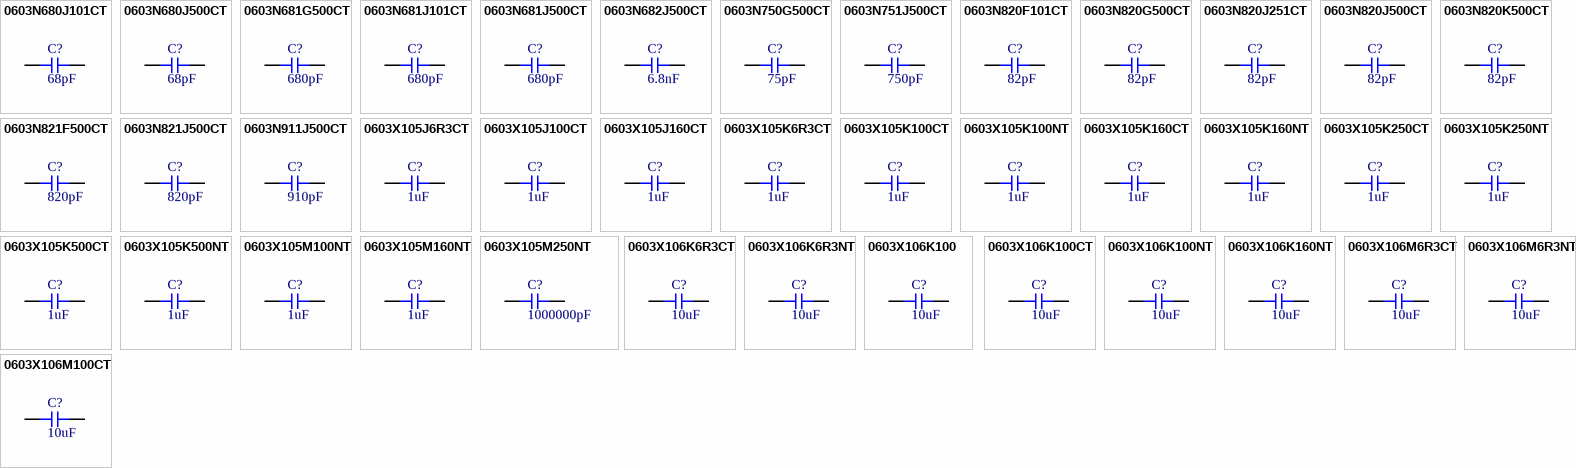
[diagram p19: symbols 0603N680J101CT to 0603X106M100CT]

## 0603N680J101CT
designator C?  Capacitance: 68pF  (hidden comment: *)
Capacitor, Ceramic (MLCC), 68pF, ±5%, 100V, NP0, ±5%, SMD 0603; Manufacturer: Walsin Tech Corp; Manufacturer Part Number: 0603N680J101CT; Package Size: 0603; JLCPCB Basic Part: No; JLCPCB Part Number: C123587; Supplier 1: LCSC; Category: Capacitors - MLCC; Supplier Part Number 1: C123587; Tolerance: ±5%; Voltage Rating: 100V; Temperature Coefficient: NP0; RoHS: Yes; ComponentLink1Description: Datasheet; ComponentLink1URL: https://wmsc.lcsc.com/wmsc/upload/file/pdf/v2/lcsc/2304140030_Walsin-Tech-Corp-0603N680J101CT_C123587.pdf; ComponentLink2Description: JLCPCB Part URL; ComponentLink2URL: https://jlcpcb.com/partdetail/C123587; ComponentLink3Description: LCSC Part URL; ComponentLink3URL: https://lcsc.com/product-detail/Multilayer-Ceramic-Capacitors-MLCC---SMD-SMT_Walsin-Tech-Corp-Walsin-Tech-Corp-0603N680J101CT_C123587.html
footprint CAP-0603 (0603 (1608M) Capacitor)
pins: 1, 2

## 0603N680J500CT
designator C?  Capacitance: 68pF  (hidden comment: *)
Capacitor, Ceramic (MLCC), 68pF, ±5%, 50V, NP0, ±5%, SMD 0603; Manufacturer: Walsin Tech Corp; Manufacturer Part Number: 0603N680J500CT; Package Size: 0603; JLCPCB Basic Part: No; JLCPCB Part Number: C123588; Supplier 1: LCSC; Category: Capacitors - MLCC; Supplier Part Number 1: C123588; Tolerance: ±5%; Voltage Rating: 50V; Temperature Coefficient: NP0; RoHS: Yes; ComponentLink1Description: Datasheet; ComponentLink1URL: https://wmsc.lcsc.com/wmsc/upload/file/pdf/v2/lcsc/2304140030_Walsin-Tech-Corp-0603N680J500CT_C123588.pdf; ComponentLink2Description: JLCPCB Part URL; ComponentLink2URL: https://jlcpcb.com/partdetail/C123588; ComponentLink3Description: LCSC Part URL; ComponentLink3URL: https://lcsc.com/product-detail/Multilayer-Ceramic-Capacitors-MLCC---SMD-SMT_Walsin-Tech-Corp-Walsin-Tech-Corp-0603N680J500CT_C123588.html
footprint CAP-0603 (0603 (1608M) Capacitor)
pins: 1, 2

## 0603N681G500CT
designator C?  Capacitance: 680pF  (hidden comment: *)
Capacitor, Ceramic (MLCC), 680pF, ±2%, 50V, NP0, ±2%, SMD 0603; Manufacturer: Walsin Tech Corp; Manufacturer Part Number: 0603N681G500CT; Package Size: 0603; JLCPCB Basic Part: No; JLCPCB Part Number: C303827; Supplier 1: LCSC; Category: Capacitors - MLCC; Supplier Part Number 1: C303827; Tolerance: ±2%; Voltage Rating: 50V; Temperature Coefficient: NP0; RoHS: Yes; ComponentLink1Description: Datasheet; ComponentLink1URL: https://wmsc.lcsc.com/wmsc/upload/file/pdf/v2/lcsc/2304140030_Walsin-Tech-Corp-0603N681G500CT_C303827.pdf; ComponentLink2Description: JLCPCB Part URL; ComponentLink2URL: https://jlcpcb.com/partdetail/C303827; ComponentLink3Description: LCSC Part URL; ComponentLink3URL: https://lcsc.com/product-detail/Multilayer-Ceramic-Capacitors-MLCC---SMD-SMT_Walsin-Tech-Corp-Walsin-Tech-Corp-0603N681G500CT_C303827.html
footprint CAP-0603 (0603 (1608M) Capacitor)
pins: 1, 2

## 0603N681J101CT
designator C?  Capacitance: 680pF  (hidden comment: *)
Capacitor, Ceramic (MLCC), 680pF, ±5%, 100V, NP0, ±5%, SMD 0603; Manufacturer: Walsin Tech Corp; Manufacturer Part Number: 0603N681J101CT; Package Size: 0603; JLCPCB Basic Part: No; JLCPCB Part Number: C384775; Supplier 1: LCSC; Category: Capacitors - MLCC; Supplier Part Number 1: C384775; Tolerance: ±5%; Voltage Rating: 100V; Temperature Coefficient: NP0; RoHS: Yes; ComponentLink1Description: Datasheet; ComponentLink1URL: https://wmsc.lcsc.com/wmsc/upload/file/pdf/v2/lcsc/2304140030_Walsin-Tech-Corp-0603N681J101CT_C384775.pdf; ComponentLink2Description: JLCPCB Part URL; ComponentLink2URL: https://jlcpcb.com/partdetail/C384775; ComponentLink3Description: LCSC Part URL; ComponentLink3URL: https://lcsc.com/product-detail/Multilayer-Ceramic-Capacitors-MLCC---SMD-SMT_Walsin-Tech-Corp-Walsin-Tech-Corp-0603N681J101CT_C384775.html
footprint CAP-0603 (0603 (1608M) Capacitor)
pins: 1, 2

## 0603N681J500CT
designator C?  Capacitance: 680pF  (hidden comment: *)
Capacitor, Ceramic (MLCC), 680pF, ±5%, 50V, NP0, ±5%, SMD 0603; Manufacturer: Walsin Tech Corp; Manufacturer Part Number: 0603N681J500CT; Package Size: 0603; JLCPCB Basic Part: No; JLCPCB Part Number: C303828; Supplier 1: LCSC; Category: Capacitors - MLCC; Supplier Part Number 1: C303828; Tolerance: ±5%; Voltage Rating: 50V; Temperature Coefficient: NP0; RoHS: Yes; ComponentLink1Description: Datasheet; ComponentLink1URL: https://wmsc.lcsc.com/wmsc/upload/file/pdf/v2/lcsc/2304140030_Walsin-Tech-Corp-0603N681J500CT_C303828.pdf; ComponentLink2Description: JLCPCB Part URL; ComponentLink2URL: https://jlcpcb.com/partdetail/C303828; ComponentLink3Description: LCSC Part URL; ComponentLink3URL: https://lcsc.com/product-detail/Multilayer-Ceramic-Capacitors-MLCC---SMD-SMT_Walsin-Tech-Corp-Walsin-Tech-Corp-0603N681J500CT_C303828.html
footprint CAP-0603 (0603 (1608M) Capacitor)
pins: 1, 2

## 0603N682J500CT
designator C?  Capacitance: 6.8nF  (hidden comment: *)
Capacitor, Ceramic (MLCC), 6.8nF, ±5%, 50V, C0G, ±5%, SMD 0603; Manufacturer: Walsin Tech Corp; Manufacturer Part Number: 0603N682J500CT; Package Size: 0603; JLCPCB Basic Part: No; JLCPCB Part Number: C3894825; Supplier 1: LCSC; Category: Capacitors - MLCC; Supplier Part Number 1: C3894825; Tolerance: ±5%; Voltage Rating: 50V; Temperature Coefficient: C0G; RoHS: Yes; ComponentLink1Description: Datasheet; ComponentLink1URL: https://wmsc.lcsc.com/wmsc/upload/file/pdf/v2/lcsc/2309201536_Walsin-Tech-Corp-0603N682J500CT_C3894825.pdf; ComponentLink2Description: JLCPCB Part URL; ComponentLink2URL: https://jlcpcb.com/partdetail/C3894825; ComponentLink3Description: LCSC Part URL; ComponentLink3URL: https://lcsc.com/product-detail/Multilayer-Ceramic-Capacitors-MLCC---SMD-SMT_Walsin-Tech-Corp-Walsin-Tech-Corp-0603N682J500CT_C3894825.html
footprint CAP-0603 (0603 (1608M) Capacitor)
pins: 1, 2
